# Altium footprint library Sajad_Altium_Library.PcbLib: 380 footprints (part 5 of 24)
Each footprint in its own frame and in the unit in brackets; x right, y up, seen from the top. Pads: shape width x height; smd on the part's side, far side on the other; paste and mask are expansions set on the pad; w line width, h text height; cw(c..) or ccw(c..) is an arc to the next point about the centre after c.
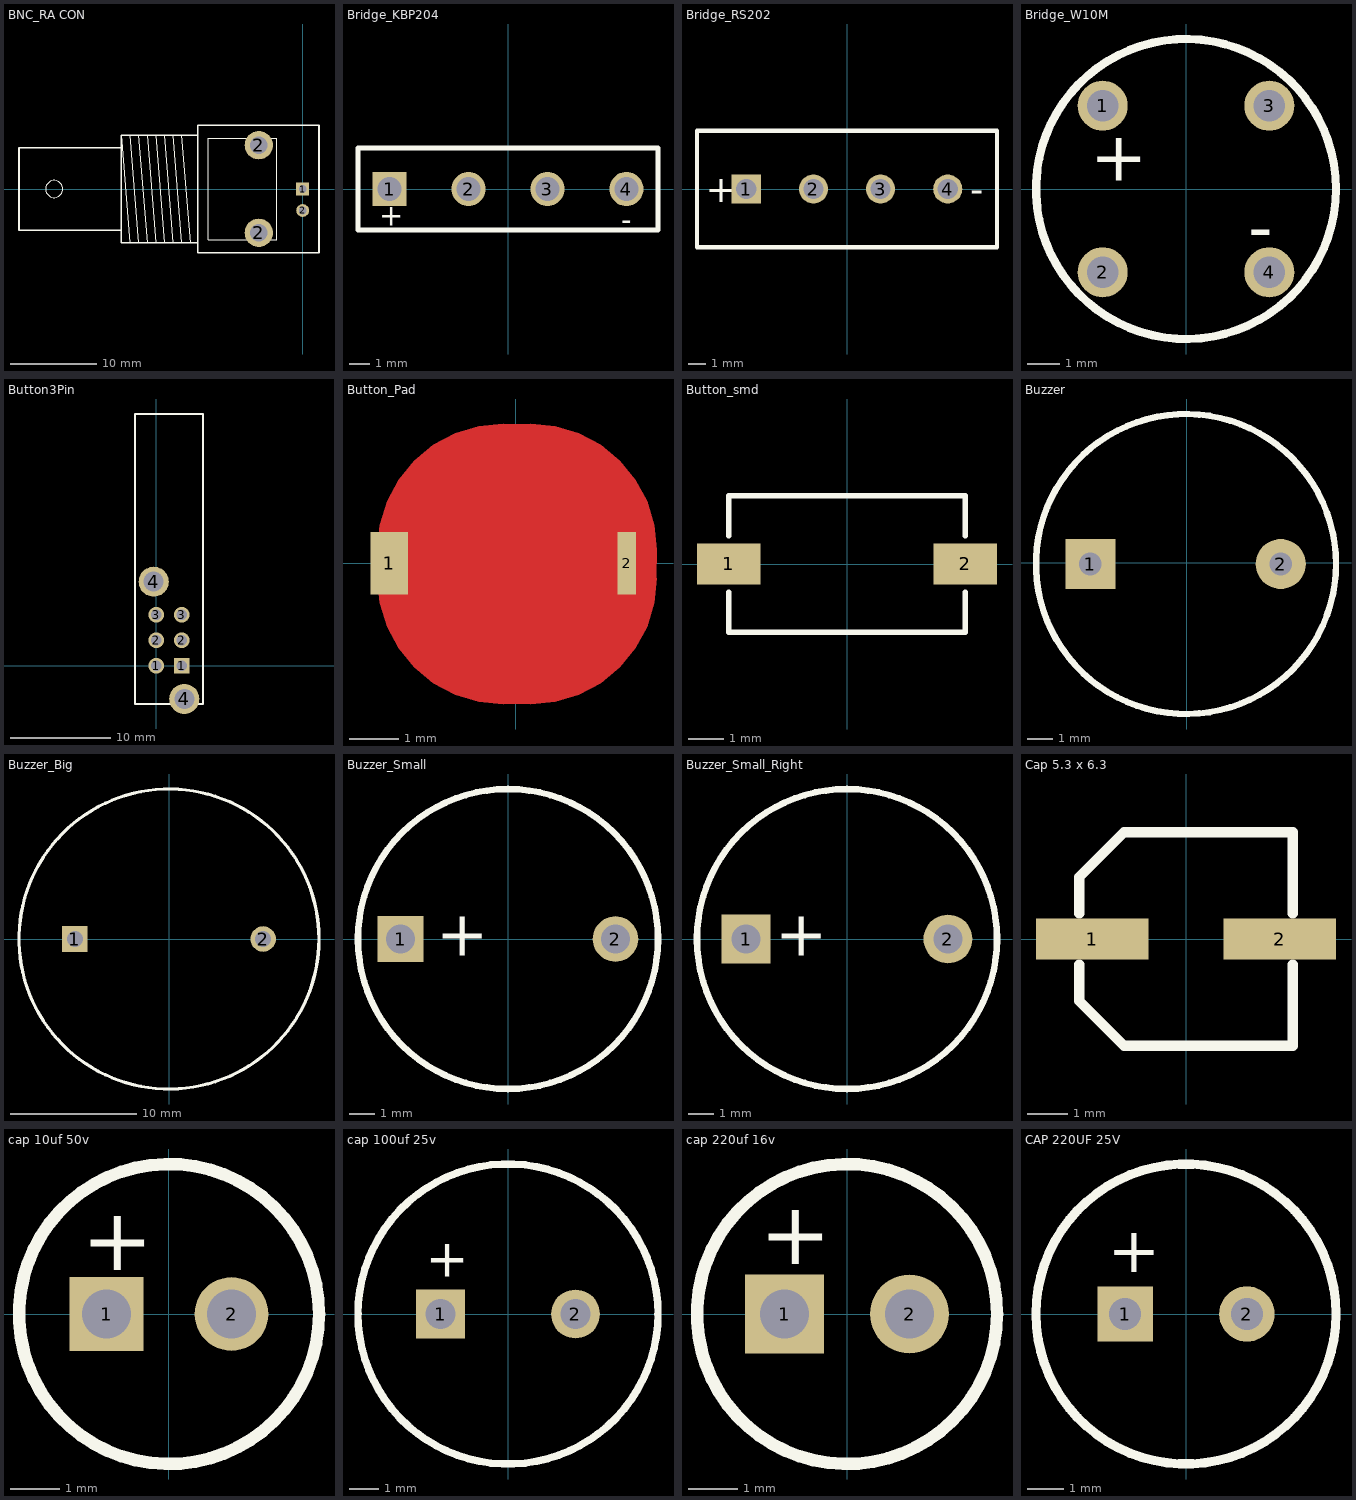
[diagram p4: the footprints below, top view; thin cyan lines are the x and y axes]

## BNC_RA CON [mm] "Connector; BNC Elbow"
height 5.85
pads (4):
  rect 1.5x1.5 hole 0.9: 1(0,0)
  round 3.3 hole 2: 2(-5.1,-5.1) 2(-5.1,5.1)
  round 1.5 hole 0.9: 2(0,-2.5)
Top Overlay:
  circle w0.025: c-28.9,0 r1
  lines w0.025: -20.1,-6.25 -21.1,6.25 ; -20.1,6.25 -19.1,-6.25 ; -19.1,6.25 -18.1,-6.25 ; -18.1,6.25 -17.1,-6.25 ; -17.1,6.25 -16.1,-6.25 ; -16.1,6.25 -15.1,-6.25 ; -15.1,6.25 -14.1,-6.25 ; -14.1,6.25 -13.1,-6.25 ; -21.1,-4.8 -33,-4.8 -33,4.8 -21.1,4.8 ; -21.1,-4.8 -21.1,4.8 ; -21.1,-4.8 -21.1,-6.25 -12.2,-6.25 ; -21.1,4.8 -21.1,6.25 ; -21.1,6.25 -12.2,6.25 ; -12.2,-6.25 -12.2,6.25 ; -12.2,-6.25 -12.2,-7.4 1.9,-7.4 1.9,7.4 -12.2,7.4 -12.2,6.25 ; -11,-5.9 -3,-5.9 -3,5.9 -11,5.9 -11,-5.9
  lines w0.2: -21.1,-4.8 -21.1,4.8 ; -21.1,-4.8 -33,-4.8 -33,4.8 -21.1,4.8 ; -21.1,-4.8 -21.1,-6.25 -12.2,-6.25 ; -21.1,4.8 -21.1,6.25 -12.2,6.25 ; -12.2,-6.25 -12.2,6.25 ; -12.2,-6.25 -12.2,-7.4 1.9,-7.4 1.9,7.4 -12.2,7.4 -12.2,6.25
3D body: height 15.62, standoff -4.37, extent -33.579,-7.391 1.981,7.366

## Bridge_KBP204 [mil] "KBP204 Diode Bridge"
pads (4):
  rect 65x65 hole 45: 1(-225,0)
  round 65 hole 45: 2(-75,0) 3(75,0) 4(225,0)
Top Overlay:
  lines w10: -285,-78 0,-78 285,-78 285,78 0,78 -285,78 -285,-78
  text "-" at 215,-78 h40
  text "+" at -245,-70 h40

## Bridge_RS202 [mil] "RS202 Diode Bridge"
pads (4):
  rect 65x65 hole 45: 1(-225,0)
  round 65 hole 45: 2(-75,0) 3(75,0) 4(225,0)
Top Overlay:
  lines w10: -335,-130 -335,130 0,130 335,130 335,-130 0,-130 -335,-130
  text "+" at -315,-30 h60
  text "-" at 275,-30 h60
3D body: height 452.76, standoff -500, extent -291.99,-102.24 281.99,95

## Bridge_W10M [mil] "W10M Diode Bridge"
pads (4):
  round 60 hole 38: 1(-100,100) 2(-100,-100) 3(100,100) 4(100,-100)
Top Overlay:
  circle w10: c0,0 r180
  text "+" at -115,10 h60
  text "-" at 75,-75 h60

## Button3Pin [mil] "Button3Pin"
pads (8):
  round 62 hole 42: 1(0,0) 2(0,100) 2(100,100) 3(0,200) 3(100,200)
  rect 62x62 hole 42: 1(100,0)
  round 118.11 hole 78.74: 4(-10,330) 4(110,-130)
Top Overlay:
  lines w7.87: -83.86,-150 -83.86,987.8 183.86,987.8 183.86,-150 -83.86,-150

## Button_Pad [mil]
pads (2):
  rect 30x50 smd: 1(-101,0)
  rect 15x50 smd: 2(88.58,0)
Top Layer:
  pour cut-out: -110.48,-12 -108.55,-31.6 -102.83,-50.45 -93.55,-67.83 -81.05,-83.05 -65.83,-95.55 -48.45,-104.83 -29.6,-110.55 -10,-112.48 -10,-112 12,-112.48 31.6,-110.55 50.45,-104.83 67.83,-95.55 83.05,-83.05 95.55,-67.83 104.83,-50.45 110.55,-31.6 112.48,-12 112,-12 112.48,11 110.55,30.6 104.83,49.45 95.55,66.83 83.05,82.05 67.83,94.55 50.45,103.83 31.6,109.55 12,111.48 12,111 -10,111.48 -29.6,109.55 -48.45,103.83 -65.83,94.55 -81.05,82.05 -93.55,66.83 -102.83,49.45 -108.55,30.6 -110.48,11 -110,11
  lines w17.72: -84,28 49,28 ; -83,-28 50,-28 ; -60,0 88.58,0 ; -28,84 29,84 ; -27,-84 27,-84 ; -21,-56 67.97,-56 ; -19,56 68,56 ; 27.11,-84.33 cw(c0,0) 28.53,83.86 ; 68.37,-56.33 ccw(c0,0) 68.38,56.31
Top Solder:
  circle w120: c0,0 r40

## Button_smd [mil]
height 220.47
pads (2):
  rect 70x45 smd: 1(-130,0) 2(130,0)
Top Overlay:
  lines w6: -130,-31 -130,-75 130,-75 130,-31 ; -130,31 -130,75 130,75 130,31
3D body: height 98.43, standoff 0, extent -157.48,-75 157.48,70.67

## Buzzer [mm]
pads (2):
  rect 2x2 hole 0.9: 1(-3.861,-0.051)
  round 2 hole 0.9: 2(3.759,-0.051)
Top Overlay:
  circle w0.254: c-0.031,-0.051 r6
3D body: height 6.98, standoff -6.1, extent -5.918,-5.918 5.918,5.918

## Buzzer_Big [mil] "Buzzer 6v to 24v"
pads (2):
  rect 80x80 hole 50: 1(-295,0)
  round 80 hole 50: 2(295,0)
Top Overlay:
  circle w10: c0,0 r470
3D body: height 736.22, standoff 0, extent -464.56,-464.56 464.57,464.57

## Buzzer_Small [mil] "Buzzer 6v to 24v"
pads (2):
  rect 70x70 hole 45: 1(-165,0)
  round 70 hole 45: 2(165,0)
Top Overlay:
  circle w10: c0,0 r230.31
  text "+" at -110,-26 h70
3D body: height 275, standoff -240, extent -233,-233 233,233

## Buzzer_Small_Right [mil] "Buzzer 6v to 24v"
pads (2):
  rect 75x75 hole 45: 1(-155,0)
  round 75 hole 45: 2(155,0)
Top Overlay:
  circle w10: c0,0 r230.31
  text "+" at -110,-26 h70
3D body: height 233, standoff -233, extent -233.01,-275.01 232.99,239.99

## Cap 5.3 x 6.3 [mm] "5.3 x 6.3 mm Smd Capacitor"
pads (2):
  rect 2.8x1.016 smd: 1(-2.327,0) 2(2.327,0)
Top Overlay:
  lines w0.254: -2.65,-0.635 -2.65,-1.541 -1.541,-2.65 2.65,-2.65 2.65,-0.635 ; -2.65,0.635 -2.65,1.541 -1.541,2.65 2.65,2.65 2.65,0.635
3D body: height 5.41, standoff 0, extent -2.95,-2.65 2.95,2.65

## cap 10uf 50v [mm] "cap 10uf 50v"
pads (2):
  rect 1.5x1.5 hole 1: 1(-1.27,0)
  round 1.5 hole 1: 2(1.27,0)
Top Overlay:
  circle w0.254: c0,0 r3.048
  text "+" at -1.778,0.889 h1.27
3D body: height 11.7, standoff -3.4, extent -2.54,-2.539 2.538,2.54

## cap 100uf 25v [mil] "cap 100uf 25v"
pads (2):
  rect 65x65 hole 40: 1(-90,0)
  round 65 hole 40: 2(90,0)
Top Overlay:
  circle w10: c0,0 r200
  text "+" at -110,50 h50
3D body: height 624.96, standoff -752.99, extent -196.85,-196.85 196.85,196.85

## cap 220uf 16v [mm] "cap 220uf 16v"
pads (2):
  rect 1.6x1.6 hole 1: 1(-1.27,0)
  round 1.6 hole 1: 2(1.27,0)
Top Overlay:
  circle w0.254: c0,0 r3.048
  text "+" at -1.778,1.016 h1.27
3D body: height 11.09, standoff -18.91, extent -3.15,-3.15 3.15,3.15

## CAP 220UF 25V [mil] "cap 220uf 25v"
pads (2):
  rect 60x60 hole 35: 1(-66,0)
  round 60 hole 35: 2(66,0)
Top Overlay:
  circle w10: c0,0 r162.5
  text "+" at -85,45 h50
3D body: height 445.89, standoff -754.41, extent -157.48,-157.48 157.48,157.48